# Altium footprint library Cty1.PcbLib: 870 footprints (part 32 of 55)
Each footprint in its own frame and in the unit in brackets; x right, y up, seen from the top. Pads: shape width x height; smd on the part's side, far side on the other; paste and mask are expansions set on the pad; w line width, h text height; cw(c..) or ccw(c..) is an arc to the next point about the centre after c.
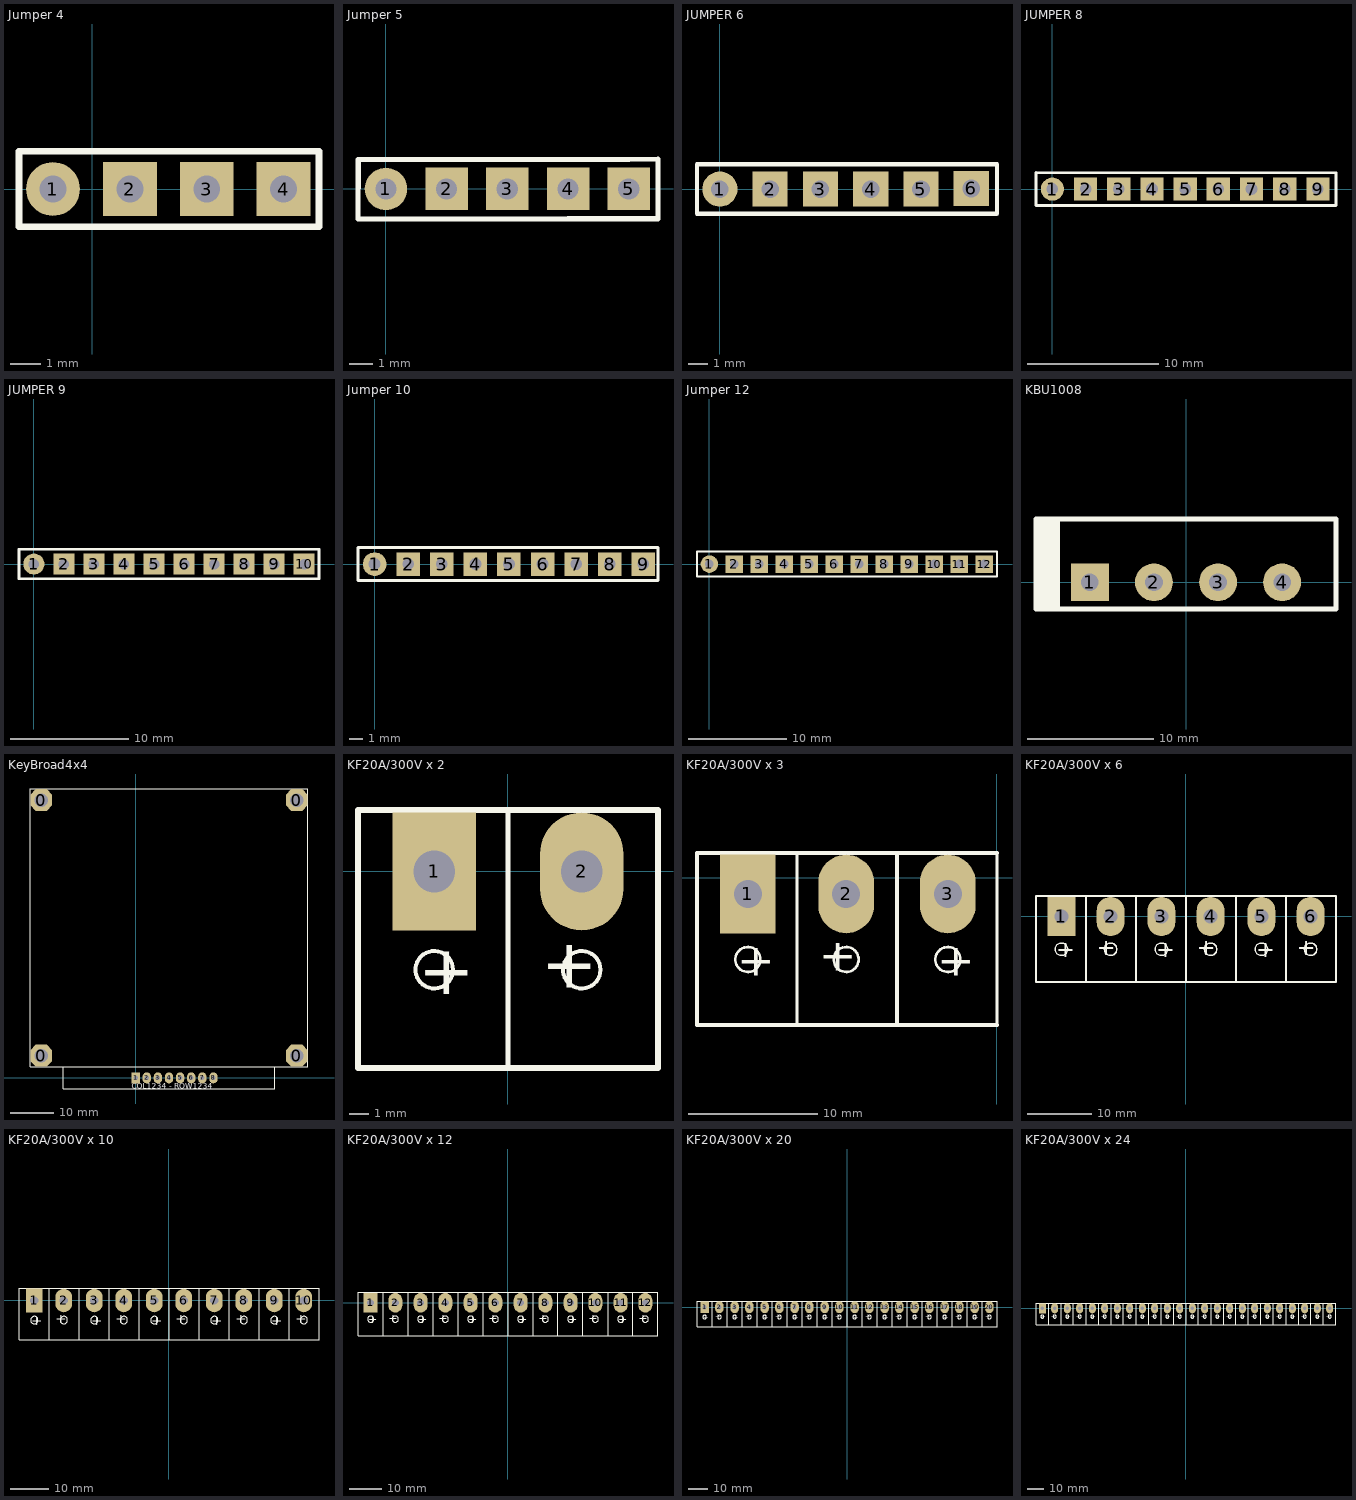
[diagram p31: the footprints below, top view; thin cyan lines are the x and y axes]

## Jumper 4 [mil]
pads (4):
  round 70 hole 35 unplated: 1(-51,0)
  rect 70x70 hole 35 unplated: 2(49,0) 3(149,0) 4(249,0)
Top Overlay:
  lines w8.66: -95.16,-48.96 -95.16,49.21 295,49.21 295,-49.21 -94.91,-49.21

## Jumper 5 [mil]
pads (5):
  round 70 hole 35 unplated: 1(0,0)
  rect 70x70 hole 35 unplated: 2(100,0) 3(200,0) 4(300,0) 5(400,0)
Top Overlay:
  lines w8.66: -46,-49.25 -45.5,48.75 300,48.46 400,48.46 448.21,49.21 448.21,-49.21 400,-49.21 300,-49.21 -46,-49.25

## JUMPER 6 [mil]
pads (6):
  round 70 hole 35 unplated: 1(0,0)
  rect 70x70 hole 35 unplated: 2(100,0) 3(200,0) 4(300,0) 5(400,0) 6(500,1.25)
Top Overlay:
  lines w8.66: -45.5,-48.75 -45.5,49.21 551.21,49.21 551.21,-48.29 550.75,-48.75 -45.5,-48.75

## JUMPER 8 [mil]
pads (9):
  round 70 hole 35 unplated: 1(0,0)
  rect 70x70 hole 35 unplated: 2(100,0) 3(200,0) 4(300,0) 5(400,0) 6(500,0) 7(600,0) 8(700,0) 9(800,0)
Top Overlay:
  lines w8.66: -49.5,-49.25 -49.5,49.5 800,49.21 854.5,49.21 854.5,-49.21 800,-49.21 -49.5,-49.25

## JUMPER 9 [mil]
pads (10):
  round 70 hole 35 unplated: 1(0,0)
  rect 70x70 hole 35 unplated: 2(100,0) 3(200,0) 4(300,0) 5(400,0) 6(500,0) 7(600,0) 8(700,0) 9(800,0) 10(900,0)
Top Overlay:
  lines w8.66: -49.5,-49.25 800,-49.21 900,-49.21 949.21,-49.21 949.21,49.21 900,49.21 800,49.21 -49.5,49.5 -49.5,-49.25

## Jumper 10 [mil]
pads (9):
  round 70 hole 35 unplated: 1(0,0)
  rect 70x70 hole 35 unplated: 2(100,0) 3(200,0) 4(300,0) 5(400,0) 6(500,0) 7(600,0) 8(700,0) 9(800,0)
Top Overlay:
  lines w8.66: 843.5,-49.25 -49.5,-49.25 -49.5,49.5 843.75,50 ; 843.71,-49.21 843.71,49.21

## Jumper 12 [mil]
pads (12):
  round 70 hole 35 unplated: 1(0,0)
  rect 70x70 hole 35 unplated: 2(100,0) 3(200,0) 4(300,0) 5(400,0) 6(500,0) 7(600,0) 8(700,0) 9(800,0) 10(900,0) 11(1000,0) 12(1100,0)
Top Overlay:
  lines w8.66: -49.5,-49.25 1151.5,-49.25 1151.5,50.17 -49.5,49.5 -49.5,-49.25

## KBU1008 [mm] "Diode bridge"
height 7.62
pads (4):
  rect 3x3 hole 1.4: 1(-7.62,0)
  round 3 hole 1.4: 2(-2.54,0) 3(2.54,0) 4(7.62,0)
Top Overlay:
  rectangle: -11.887,-2.108 -10.16,5.004
  lines w0.381: -10.16,-2.108 -10.16,5.004 ; -11.887,-2.108 -11.887,5.004 11.887,5.004 11.887,-2.108 -11.887,-2.108

## KeyBroad4x4 [mm] "KeyBroad 4x4"
height 5.08
pads (12):
  oct 5x5 hole 3.048: 0(-21.59,5.08) 0(-21.59,63.5) 0(36.83,5.08) 0(36.83,63.5)
  rect 1.905x2.5 hole 1: 1(0,0)
  oval 1.905x2.5 hole 1: 2(2.54,0) 3(5.08,0) 4(7.62,0) 5(10.16,0) 6(12.7,0) 7(15.24,0) 8(17.78,0)
Top Overlay:
  lines w0.203: -16.51,2.54 -16.51,-2.515 -16.535,-2.54 31.75,-2.54 31.75,2.489 ; -24.13,2.54 -24.13,66.04 39.37,66.04 39.37,2.54 -24.13,2.54
  text "COL1234 - ROW1234" at -0.889,-2.464 h1.27

## KF20A/300V x 2 [mil] "Jac nguon 220V 20A XANH"
pads (2):
  rect 170x240 hole 85: 1(-150,0)
  oval 170x240 hole 85: 2(150,0)
Top Overlay:
  circle w8: c150,-200 r38.08
  circle w8: c-150,-200 r38.08
  lines w10: 0,-400 0,125
  lines w11.81: 305.12,-400 -305.12,-400 -305.12,125 305.12,125 ; 305.12,-400 305.12,125 ; 305.12,-400 305.12,125
  text "+" at 183,-150 h100
  text "+" at -183,-250 h100

## KF20A/300V x 3 [mil] "Jac nguon 220V 20A XANH"
height 500
pads (3):
  rect 170x240 hole 85: 1(-760.24,-50)
  oval 170x240 hole 85: 2(-460.24,-50) 3(-150,-50)
Top Overlay:
  circle w8: c-460.24,-250 r38.08
  circle w8: c-760.24,-250 r38.08
  circle w8: c-150,-250 r38.08
  lines w10: -610.24,-450 -610.24,75 ; 0,-450 0,75
  lines w11.81: 0,-450 -305.12,-450 ; 0,75 -915.35,75 -915.35,-450 -305.12,-450 ; -305.12,-450 -305.12,75 -305.12,-450
  text "+" at -427.24,-200 h100
  text "+" at -793.24,-300 h100
  text "+" at -183,-300 h100

## KF20A/300V x 6 [mil] "Jac nguon 220V 20A XANH"
height 216.54
pads (6):
  rect 170x240 hole 85: 1(-760.24,0)
  oval 170x240 hole 85: 2(-460.24,0) 3(-150,0) 4(150,0) 5(460.24,0) 6(760.24,0)
Top Overlay:
  circle w8: c460.24,-200 r38.08
  circle w8: c760.24,-200 r38.08
  circle w8: c150,-200 r38.08
  circle w8: c-150,-200 r38.08
  circle w8: c-760.24,-200 r38.08
  circle w8: c-460.24,-200 r38.08
  lines w10: -610.24,-400 -610.24,125 ; 0,-400 0,125 ; 610.24,-400 610.24,125
  lines w11.81: -305.12,-400 305.12,-400 ; -305.12,-400 -305.12,125 ; -305.12,-400 -305.12,125 ; -305.12,-400 -915.35,-400 -915.35,125 -305.12,125 ; -305.12,125 305.12,125 ; 305.12,-400 305.12,125 ; 305.12,-400 915.35,-400 ; 305.12,-400 305.12,125 ; 305.12,125 915.35,125 ; 915.35,-400 915.35,125 ; 915.35,-400 915.35,125
  text "+" at 427.24,-250 h100
  text "+" at 793.24,-150 h100
  text "+" at 183,-150 h100
  text "+" at -183,-250 h100
  text "+" at -793.24,-250 h100
  text "+" at -427.24,-150 h100

## KF20A/300V x 10 [mil] "Jac nguon 220V 20A XANH"
height 216.54
pads (10):
  rect 170x240 hole 85: 1(-1370.47,0)
  oval 170x240 hole 85: 2(-1070.47,0) 3(-760.24,0) 4(-460.24,0) 5(-150,0) 6(150,0) 7(460.24,0) 8(760.24,0) 9(1070.47,0) 10(1370.47,0)
Top Overlay:
  circle w8: c-1070.47,-200 r38.08
  circle w8: c-1370.47,-200 r38.08
  circle w8: c-760.24,-200 r38.08
  circle w8: c-460.24,-200 r38.08
  circle w8: c150,-200 r38.08
  circle w8: c-150,-200 r38.08
  circle w8: c760.24,-200 r38.08
  circle w8: c460.24,-200 r38.08
  circle w8: c1370.47,-200 r38.08
  circle w8: c1070.47,-200 r38.08
  lines w10: -1220.47,-400 -1220.47,125 ; -610.24,-400 -610.24,125 ; 0,-400 0,125 ; 610.24,-400 610.24,125 ; 1220.47,-400 1220.47,125
  lines w11.81: -915.35,-400 -1525.59,-400 -1525.59,125 -915.35,125 ; -915.35,-400 -915.35,125 ; -915.35,-400 -915.35,125 ; -915.35,-400 -305.12,-400 ; -915.35,125 -305.12,125 ; -305.12,-400 -305.12,125 ; -305.12,-400 305.12,-400 ; -305.12,-400 -305.12,125 ; -305.12,125 305.12,125 ; 305.12,-400 305.12,125 ; 305.12,-400 915.35,-400 ; 305.12,-400 305.12,125 ; 305.12,125 915.35,125 ; 915.35,-400 915.35,125 ; 915.35,-400 1525.59,-400 ; 915.35,-400 915.35,125 ; 915.35,125 1525.59,125 ; 1525.59,-400 1525.59,125 ; 1525.59,-400 1525.59,125
  text "+" at -1037.47,-150 h100
  text "+" at -1403.47,-250 h100
  text "+" at -793.24,-250 h100
  text "+" at -427.24,-150 h100
  text "+" at 183,-150 h100
  text "+" at -183,-250 h100
  text "+" at 793.24,-150 h100
  text "+" at 427.24,-250 h100
  text "+" at 1403.47,-150 h100
  text "+" at 1037.47,-250 h100

## KF20A/300V x 12 [mil] "Jac nguon 220V 20A XANH"
height 216.54
pads (12):
  rect 170x240 hole 85: 1(-1675.59,0)
  oval 170x240 hole 85: 2(-1375.59,0) 3(-1065.35,0) 4(-765.35,0) 5(-455.12,0) 6(-155.12,0) 7(155.12,0) 8(455.12,0) 9(765.35,0) 10(1065.35,0) 11(1375.59,0) 12(1675.59,0)
Top Overlay:
  circle w8: c-1375.59,-200 r38.08
  circle w8: c-1675.59,-200 r38.08
  circle w8: c-1065.35,-200 r38.08
  circle w8: c-765.35,-200 r38.08
  circle w8: c-155.12,-200 r38.08
  circle w8: c-455.12,-200 r38.08
  circle w8: c455.12,-200 r38.08
  circle w8: c155.12,-200 r38.08
  circle w8: c1065.35,-200 r38.08
  circle w8: c765.35,-200 r38.08
  circle w8: c1675.59,-200 r38.08
  circle w8: c1375.59,-200 r38.08
  lines w10: -1525.59,-400 -1525.59,125 ; -915.35,-400 -915.35,125 ; -305.12,-400 -305.12,125 ; 305.12,-400 305.12,125 ; 915.35,-400 915.35,125 ; 1525.59,-400 1525.59,125
  lines w11.81: -1220.47,-400 -1830.71,-400 -1830.71,125 -1220.47,125 ; -1220.47,-400 -1220.47,125 ; -1220.47,-400 -1220.47,125 ; -1220.47,-400 -610.24,-400 ; -1220.47,125 -610.24,125 ; -610.24,-400 -610.24,125 ; -610.24,-400 0,-400 ; -610.24,-400 -610.24,125 ; -610.24,125 0,125 ; 0,-400 0,125 ; 0,-400 610.24,-400 ; 0,-400 0,125 ; 0,125 610.24,125 ; 610.24,-400 610.24,125 ; 610.24,-400 1220.47,-400 ; 610.24,-400 610.24,125 ; 610.24,125 1220.47,125 ; 1220.47,-400 1220.47,125 ; 1220.47,-400 1830.71,-400 ; 1220.47,-400 1220.47,125 ; 1220.47,125 1830.71,125 ; 1830.71,-400 1830.71,125 ; 1830.71,-400 1830.71,125
  text "+" at -1342.59,-150 h100
  text "+" at -1708.59,-250 h100
  text "+" at -1098.35,-250 h100
  text "+" at -732.35,-150 h100
  text "+" at -122.12,-150 h100
  text "+" at -488.12,-250 h100
  text "+" at 488.12,-150 h100
  text "+" at 122.12,-250 h100
  text "+" at 1098.35,-150 h100
  text "+" at 732.35,-250 h100
  text "+" at 1708.59,-150 h100
  text "+" at 1342.59,-250 h100

## KF20A/300V x 20 [mil] "Jac nguon 220V 20A XANH"
height 216.54
pads (20):
  rect 170x240 hole 85: 1(-2896.06,0)
  oval 170x240 hole 85: 2(-2596.06,0) 3(-2285.83,0) 4(-1985.83,0) 5(-1675.59,0) 6(-1375.59,0) 7(-1065.35,0) 8(-765.35,0) 9(-455.12,0) 10(-155.12,0) 11(155.12,0) 12(455.12,0) 13(765.35,0) 14(1065.35,0) 15(1375.59,0) 16(1675.59,0) 17(1985.83,0) 18(2285.83,0) 19(2596.06,0) 20(2896.06,0)
Top Overlay:
  circle w8: c2596.06,-200 r38.08
  circle w8: c2896.06,-200 r38.08
  circle w8: c1985.83,-200 r38.08
  circle w8: c2285.83,-200 r38.08
  circle w8: c1375.59,-200 r38.08
  circle w8: c1675.59,-200 r38.08
  circle w8: c765.35,-200 r38.08
  circle w8: c1065.35,-200 r38.08
  circle w8: c155.12,-200 r38.08
  circle w8: c455.12,-200 r38.08
  circle w8: c-455.12,-200 r38.08
  circle w8: c-155.12,-200 r38.08
  circle w8: c-1065.35,-200 r38.08
  circle w8: c-765.35,-200 r38.08
  circle w8: c-1675.59,-200 r38.08
  circle w8: c-1375.59,-200 r38.08
  circle w8: c-1985.83,-200 r38.08
  circle w8: c-2285.83,-200 r38.08
  circle w8: c-2896.06,-200 r38.08
  circle w8: c-2596.06,-200 r38.08
  lines w10: -2746.06,-400 -2746.06,125 ; -2135.83,-400 -2135.83,125 ; -1525.59,-400 -1525.59,125 ; -915.35,-400 -915.35,125 ; -305.12,-400 -305.12,125 ; 305.12,-400 305.12,125 ; 915.35,-400 915.35,125 ; 1525.59,-400 1525.59,125 ; 2135.83,-400 2135.83,125 ; 2746.06,-400 2746.06,125
  lines w11.81: -2440.94,-400 -1830.71,-400 ; -2440.94,-400 -2440.94,125 ; -2440.94,-400 -2440.94,125 ; -2440.94,-400 -3051.18,-400 -3051.18,125 -2440.94,125 ; -2440.94,125 -1830.71,125 ; -1830.71,-400 -1830.71,125 ; -1830.71,-400 -1220.47,-400 ; -1830.71,-400 -1830.71,125 ; -1830.71,125 -1220.47,125 ; -1220.47,-400 -1220.47,125 ; -1220.47,-400 -610.24,-400 ; -1220.47,-400 -1220.47,125 ; -1220.47,125 -610.24,125 ; -610.24,-400 -610.24,125 ; -610.24,-400 0,-400 ; -610.24,-400 -610.24,125 ; -610.24,125 0,125 ; 0,-400 0,125 ; 0,-400 610.24,-400 ; 0,-400 0,125 ; 0,125 610.24,125 ; 610.24,-400 610.24,125 ; 610.24,-400 1220.47,-400 ; 610.24,-400 610.24,125 ; 610.24,125 1220.47,125 ; 1220.47,-400 1220.47,125 ; 1220.47,-400 1830.71,-400 ; 1220.47,-400 1220.47,125 ; 1220.47,125 1830.71,125 ; 1830.71,-400 1830.71,125 ; 1830.71,-400 2440.94,-400 ; 1830.71,-400 1830.71,125 ; 1830.71,125 2440.94,125 ; 2440.94,-400 2440.94,125 ; 2440.94,-400 3051.18,-400 3051.18,125 2440.94,125 ; 2440.94,-400 2440.94,125
  text "+" at 2563.06,-250 h100
  text "+" at 2929.06,-150 h100
  text "+" at 1952.83,-250 h100
  text "+" at 2318.83,-150 h100
  text "+" at 1342.59,-250 h100
  text "+" at 1708.59,-150 h100
  text "+" at 732.35,-250 h100
  text "+" at 1098.35,-150 h100
  text "+" at 122.12,-250 h100
  text "+" at 488.12,-150 h100
  text "+" at -488.12,-250 h100
  text "+" at -122.12,-150 h100
  text "+" at -1098.35,-250 h100
  text "+" at -732.35,-150 h100
  text "+" at -1708.59,-250 h100
  text "+" at -1342.59,-150 h100
  text "+" at -1952.83,-150 h100
  text "+" at -2318.83,-250 h100
  text "+" at -2929.06,-250 h100
  text "+" at -2563.06,-150 h100

## KF20A/300V x 24 [mil] "Jac nguon 220V 20A"
pads (24):
  rect 170x240 hole 85: 1(-3506.3,0)
  oval 170x240 hole 85: 2(-3206.3,0) 3(-2896.06,0) 4(-2596.06,0) 5(-2285.83,0) 6(-1985.83,0) 7(-1675.59,0) 8(-1375.59,0) 9(-1065.35,0) 10(-765.35,0) 11(-455.12,0) 12(-155.12,0) 13(155.12,0) 14(455.12,0) 15(765.35,0) 16(1065.35,0) 17(1375.59,0) 18(1675.59,0) 19(1985.83,0) 20(2285.83,0) 21(2596.06,0) 22(2896.06,0) 23(3206.3,0) 24(3506.3,0)
Top Overlay:
  circle w8: c2596.06,-200 r38.08
  circle w8: c2896.06,-200 r38.08
  circle w8: c-3206.3,-200 r38.08
  circle w8: c-3506.3,-200 r38.08
  circle w8: c-2896.06,-200 r38.08
  circle w8: c-2596.06,-200 r38.08
  circle w8: c-1985.83,-200 r38.08
  circle w8: c-2285.83,-200 r38.08
  circle w8: c-1375.59,-200 r38.08
  circle w8: c-1675.59,-200 r38.08
  circle w8: c-765.35,-200 r38.08
  circle w8: c-1065.35,-200 r38.08
  circle w8: c-155.12,-200 r38.08
  circle w8: c-455.12,-200 r38.08
  circle w8: c455.12,-200 r38.08
  circle w8: c155.12,-200 r38.08
  circle w8: c1065.35,-200 r38.08
  circle w8: c765.35,-200 r38.08
  circle w8: c1675.59,-200 r38.08
  circle w8: c1375.59,-200 r38.08
  circle w8: c2285.83,-200 r38.08
  circle w8: c1985.83,-200 r38.08
  circle w8: c3506.3,-200 r38.08
  circle w8: c3206.3,-200 r38.08
  lines w10: -3356.3,-400 -3356.3,125 ; -2746.06,-400 -2746.06,125 ; -2135.83,-400 -2135.83,125 ; -1525.59,-400 -1525.59,125 ; -915.35,-400 -915.35,125 ; -305.12,-400 -305.12,125 ; 305.12,-400 305.12,125 ; 915.35,-400 915.35,125 ; 1525.59,-400 1525.59,125 ; 2135.83,-400 2135.83,125 ; 2746.06,-400 2746.06,125 ; 3356.3,-400 3356.3,125
  lines w11.81: -3051.18,-400 -3661.42,-400 -3661.42,125 -3051.18,125 ; -3051.18,-400 -3051.18,125 ; -3051.18,-400 -3051.18,125 ; -3051.18,-400 -2440.94,-400 ; -3051.18,125 -2440.94,125 ; -2440.94,-400 -2440.94,125 ; -2440.94,-400 -1830.71,-400 ; -2440.94,-400 -2440.94,125 ; -2440.94,125 -1830.71,125 ; -1830.71,-400 -1830.71,125 ; -1830.71,-400 -1220.47,-400 ; -1830.71,-400 -1830.71,125 ; -1830.71,125 -1220.47,125 ; -1220.47,-400 -1220.47,125 ; -1220.47,-400 -610.24,-400 ; -1220.47,-400 -1220.47,125 ; -1220.47,125 -610.24,125 ; -610.24,-400 -610.24,125 ; -610.24,-400 0,-400 ; -610.24,-400 -610.24,125 ; -610.24,125 0,125 ; 0,-400 0,125 ; 0,-400 610.24,-400 ; 0,-400 0,125 ; 0,125 610.24,125 ; 610.24,-400 610.24,125 ; 610.24,-400 1220.47,-400 ; 610.24,-400 610.24,125 ; 610.24,125 1220.47,125 ; 1220.47,-400 1220.47,125 ; 1220.47,-400 1830.71,-400 ; 1220.47,-400 1220.47,125 ; 1220.47,125 1830.71,125 ; 1830.71,-400 1830.71,125 ; 1830.71,-400 2440.94,-400 ; 1830.71,-400 1830.71,125 ; 1830.71,125 2440.94,125 ; 2440.94,-400 3051.18,-400 ; 2440.94,-400 2440.94,125 ; 2440.94,-400 2440.94,125 ; 2440.94,125 3051.18,125 ; 3051.18,-400 3051.18,125 ; 3051.18,-400 3051.18,125 ; 3051.18,-400 3661.42,-400 3661.42,125 3051.18,125
  text "+" at 2563.06,-250 h100
  text "+" at 2929.06,-150 h100
  text "+" at -3173.3,-150 h100
  text "+" at -3539.3,-250 h100
  text "+" at -2929.06,-250 h100
  text "+" at -2563.06,-150 h100
  text "+" at -1952.83,-150 h100
  text "+" at -2318.83,-250 h100
  text "+" at -1342.59,-150 h100
  text "+" at -1708.59,-250 h100
  text "+" at -732.35,-150 h100
  text "+" at -1098.35,-250 h100
  text "+" at -122.12,-150 h100
  text "+" at -488.12,-250 h100
  text "+" at 488.12,-150 h100
  text "+" at 122.12,-250 h100
  text "+" at 1098.35,-150 h100
  text "+" at 732.35,-250 h100
  text "+" at 1708.59,-150 h100
  text "+" at 1342.59,-250 h100
  text "+" at 2318.83,-150 h100
  text "+" at 1952.83,-250 h100
  text "+" at 3539.3,-150 h100
  text "+" at 3173.3,-250 h100